# Altium footprint library u025Library.PcbLib: 132 footprints (part 4 of 9)
Each footprint in its own frame and in the unit in brackets; x right, y up, seen from the top. Pads: shape width x height; smd on the part's side, far side on the other; paste and mask are expansions set on the pad; w line width, h text height; cw(c..) or ccw(c..) is an arc to the next point about the centre after c.
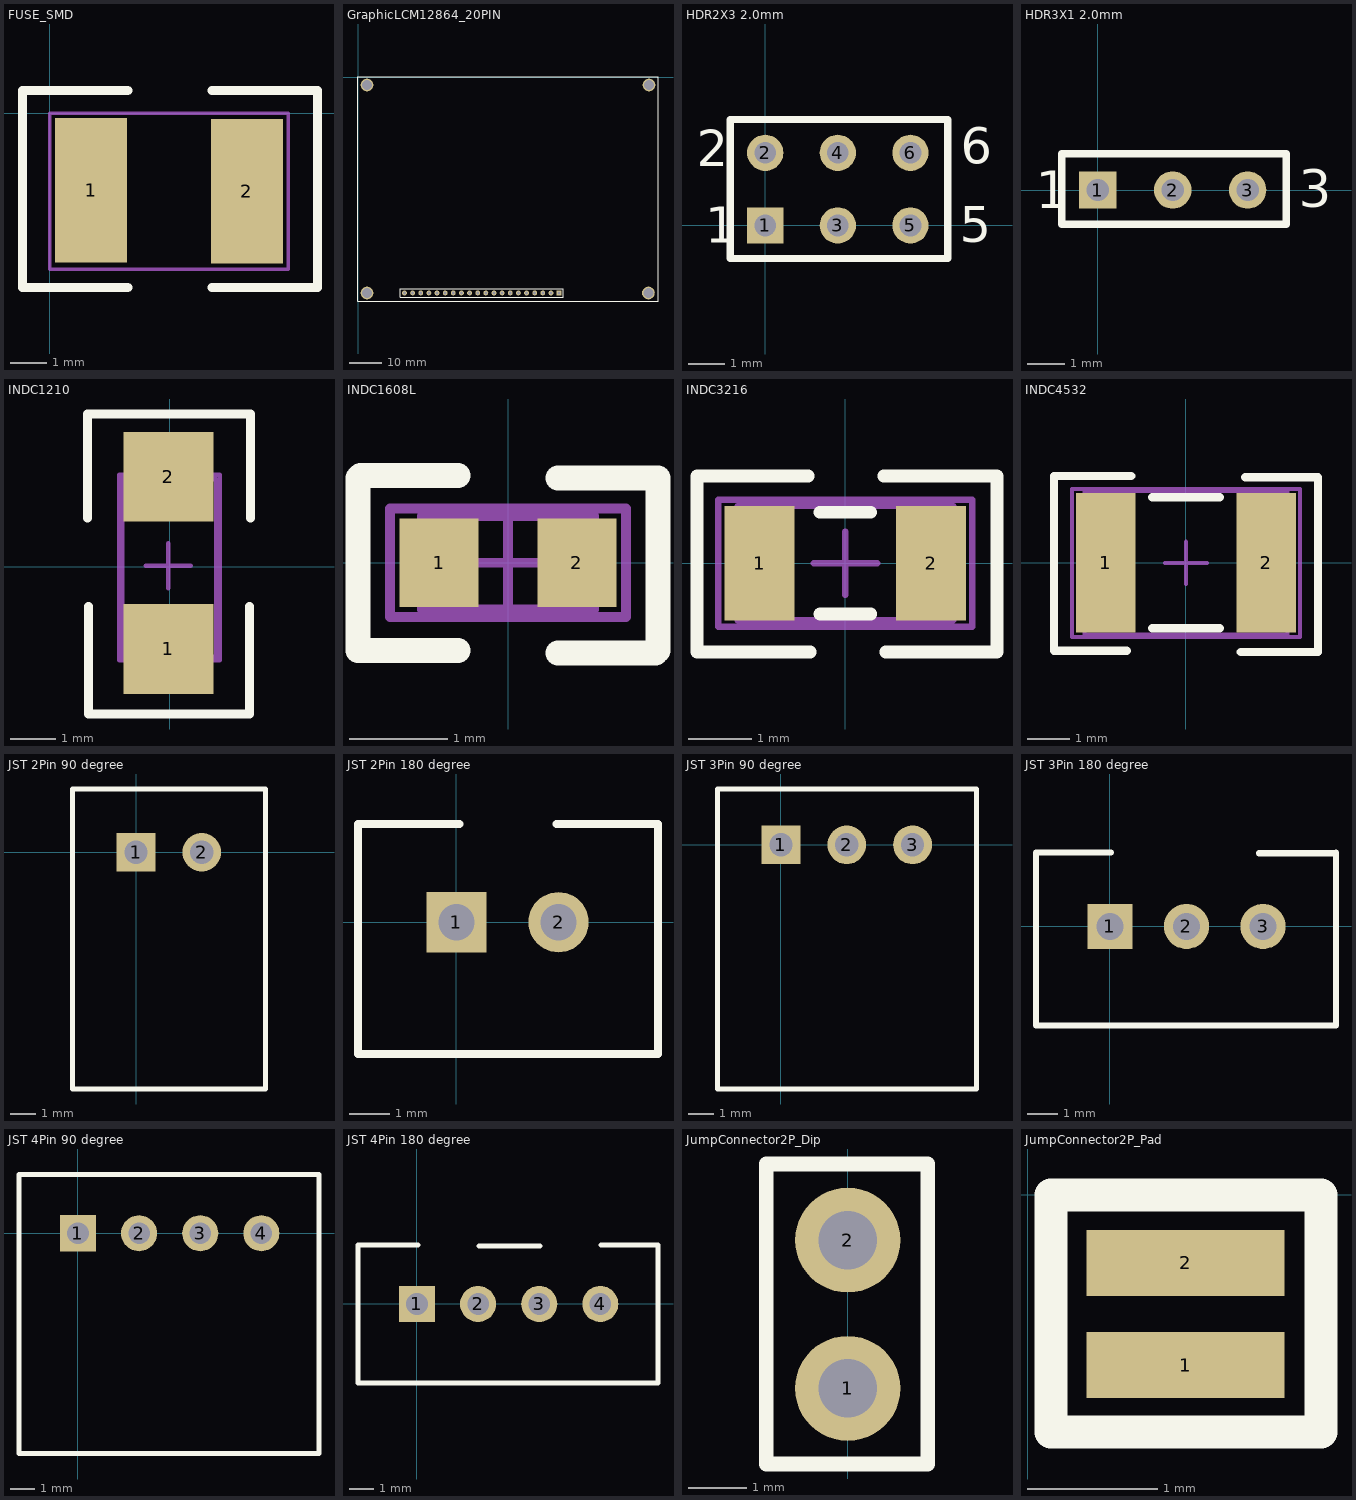
[diagram p3: the footprints below, top view; thin cyan lines are the x and y axes]

## FUSE_SMD [mm] "FUSE_SMD"
pads (2):
  rect 2x4 smd: 1(1.143,-2.134) 2(5.461,-2.159)
Top Overlay:
  lines w0.254: 2.159,-4.826 -0.762,-4.826 -0.762,0.635 2.159,0.635 ; 4.496,-4.826 7.417,-4.826 7.417,0.635 4.496,0.635
Mechanical 15:
  lines w0.1: 0,-4.318 0,0 6.604,0 6.604,-4.318 0,-4.318
3D body: height 1.03, standoff 0, extent 0.881,-3.899 5.616,-0.419

## GraphicLCM12864_20PIN [mm] "GraphicLCM12864_20PIN_15mm"
height 20
pads (24):
  rect 1.5x1.5 hole 0.9: 1(62.726,-67.386)
  round 1.5 hole 0.9: 2(60.186,-67.386) 3(57.646,-67.386) 4(55.106,-67.386) 5(52.566,-67.386) 6(50.026,-67.386) 7(47.486,-67.386) 8(44.946,-67.386) 9(42.406,-67.386) 10(39.866,-67.386) 11(37.326,-67.386) 12(34.786,-67.386) 13(32.246,-67.386) 14(29.706,-67.386) 15(27.166,-67.386) 16(24.626,-67.386) 17(22.086,-67.386) 18(19.546,-67.386) 19(17.006,-67.386) 20(14.466,-67.386)
  round 4 hole 3.2: ""(2.766,-67.386) ""(2.766,-2.474) ""(90.587,-67.386) ""(90.787,-2.474)
Top Overlay:
  lines w0.2: 13.196,-68.656 62.091,-68.656 63.996,-68.656 63.996,-66.116 13.196,-66.116 13.196,-68.656
  lines w0.254: -0.034,-69.9 93.587,-69.9 93.587,0.026 -0.034,0.026 -0.034,-69.9
3D body: height -7, standoff -20.6, extent 0.598,-69.977 93.598,0.023

## HDR2X3 2.0mm [mm] "Connector; Header; 3x2 Position 2.0mm"
pads (6):
  rect 1x1 hole 0.6: 1(0,0)
  round 1 hole 0.6: 2(0,2) 3(2,0) 4(2,2) 5(4,0) 6(4,2)
Top Overlay:
  lines w0.2: -0.965,-0.914 5.029,-0.914 5.029,2.921 -0.965,2.921 -0.965,-0.914
  text "1" at -1.651,-0.483 h1
  text "2" at -1.88,1.626 h1
  text "5" at 5.359,-0.457 h1
  text "6" at 5.385,1.702 h1

## HDR3X1 2.0mm [mm] "Connector; Header; 31 Position 2.0mm"
pads (3):
  rect 1x1 hole 0.6: 1(0,0)
  round 1 hole 0.6: 2(2,0) 3(4,0)
Top Overlay:
  lines w0.2: -0.965,-0.914 5.029,-0.914 5.029,0.968 -0.965,0.968 -0.965,-0.914
  text "1" at -1.651,-0.483 h1
  text "3" at 5.359,-0.457 h1

## INDC1210 [mm] "Chip Inductor, Body 3.2mm x 2.5mm, IPC High Density"
height 2
pads (2):
  rect 2x2 smd: 1(-0.025,-1.829) 2(-0.025,2.007)
Top Overlay:
  lines w0.2: -1.829,1.086 -1.829,3.404 1.803,3.404 1.803,1.086 ; -1.803,-0.883 -1.803,-3.277 1.778,-3.277 1.778,-0.883
Mechanical 13:
  lines w0.1: -1.052,-2.007 1.041,-2.007 1.041,1.956 -1.052,1.956 -1.052,-2.007
Mechanical 15:
  lines w0.1: -0.525,0.025 0.475,0.025 ; -0.025,-0.475 -0.025,0.525 ; -1.118,-2.083 1.118,-2.083 1.118,2.051 -1.118,2.051 -1.118,-2.083
3D body: height 3.2, standoff 0, extent -1.6,-2.098 1.6,2.402

## INDC1608L [mm] "Chip Inductor, Body 1.6x0.8mm, IPC High Density"
height 0.55
pads (2):
  rect 0.8x0.9 smd: 1(-0.7,0) 2(0.7,0)
Top Overlay:
  lines w0.254: -0.508,-0.889 -1.524,-0.889 -1.524,0.864 -1.499,0.889 -0.508,0.889 ; 0.508,-0.914 1.499,-0.914 ; 0.508,0.864 1.524,0.864 1.524,-0.889
Mechanical 13:
  lines w0.1: -0.875,-0.475 0.875,-0.475 0.875,0.475 -0.875,0.475 -0.875,-0.475
Mechanical 15:
  lines w0.1: -0.475,0 0.475,0 ; 0,-0.475 0,0.475 ; -1.2,-0.55 1.2,-0.55 1.2,0.55 -1.2,0.55 -1.2,-0.55
3D body: height 0.4, standoff -0.4, extent -0.8,-0.467 0.8,0.483

## INDC3216 [mm] "Chip Inductor, Body 3.2x1.6mm, IPC High Density"
height 0.55
pads (2):
  rect 1.1x1.8 smd: 1(-1.35,0) 2(1.35,0)
Top Overlay:
  lines w0.2: -0.584,1.372 -2.337,1.372 -2.337,-1.397 -0.552,-1.397 ; -0.4,-0.8 0.4,-0.8 ; -0.4,0.8 0.4,0.8 ; 0.603,1.372 2.388,1.372 2.388,-1.397 0.635,-1.397
Mechanical 13:
  lines w0.1: -1.7,-0.9 1.7,-0.9 1.7,0.9 -1.7,0.9 -1.7,-0.9
Mechanical 15:
  lines w0.1: -0.5,0 0.5,0 ; 0,-0.5 0,0.5 ; -2,-1 2,-1 2,1 -2,1 -2,-1
3D body: height 1.25, standoff -1.25, extent -1.498,-0.766 1.702,0.584

## INDC4532 [mm] "Chip Inductor, Body 4.5x3.2mm, IPC High Density"
height 0.55
pads (2):
  rect 1.4x3.3 smd: 1(-1.9,0) 2(1.9,0)
Top Overlay:
  lines w0.2: -1.397,-2.083 -3.124,-2.083 -3.124,2.057 -1.295,2.057 ; -0.8,-1.55 0.8,-1.55 ; -0.8,1.55 0.8,1.55 ; 1.295,-2.108 3.124,-2.108 3.124,2.032 1.397,2.032
Mechanical 13:
  lines w0.1: -2.4,-1.7 2.4,-1.7 2.4,1.7 -2.4,1.7 -2.4,-1.7
Mechanical 15:
  lines w0.1: -0.5,0 0.5,0 ; 0,-0.5 0,0.5 ; -2.7,-1.75 2.7,-1.75 2.7,1.75 -2.7,1.75 -2.7,-1.75
3D body: height 1.75, standoff 0, extent -2.148,-1.575 2.352,1.625

## JST 2Pin 90 degree [mm] "Connector; JST; 2 Position 90"
pads (2):
  rect 1.5x1.5 hole 0.9: 1(0,0)
  round 1.5 hole 0.9: 2(2.54,0)
Top Overlay:
  lines w0.2: 4.978,2.443 -2.45,2.443 -2.45,-9.151 4.996,-9.151 4.996,2.443
3D body: height 6.1, standoff -2, extent -2.442,-9.141 4.958,2.359

## JST 2Pin 180 degree [mm] "Connector; JST; 2 Position 180"
pads (2):
  rect 1.5x1.5 hole 0.9: 1(0,0)
  round 1.5 hole 0.9: 2(2.54,0)
Top Overlay:
  lines w0.2: 0.074,2.443 -2.45,2.443 -2.45,-3.28 5.013,-3.28 5.013,2.443 2.489,2.443
3D body: height 7, standoff -3.4, extent -2.384,-3.409 5.016,2.341

## JST 3Pin 90 degree [mm] "Connector; JST; 3 Position 90"
pads (3):
  rect 1.5x1.5 hole 0.9: 1(0,0)
  round 1.5 hole 0.9: 2(2.54,0) 3(5.08,0)
Top Overlay:
  lines w0.2: -2.45,-9.426 -2.45,2.153 7.551,2.153 7.551,-9.426 -2.45,-9.426
3D body: height 2.87, standoff -6.27, extent -2.453,-9.42 7.453,2.086

## JST 3Pin 180 degree [mm] "Connector; JST; 3 Position"
pads (3):
  rect 1.5x1.5 hole 0.9: 1(0,0)
  round 1.5 hole 0.9: 2(2.54,0) 3(5.08,0)
Top Overlay:
  lines w0.2: 0.043,2.443 -2.45,2.443 -2.45,-3.28 7.498,-3.28 7.498,2.443 ; 4.94,2.425 7.434,2.425
3D body: height 7, standoff -3.4, extent -2.44,-3.42 7.46,2.33

## JST 4Pin 90 degree [mm] "Connector; JST; 4 Position 90"
pads (4):
  rect 1.5x1.5 hole 0.9: 1(0,0)
  round 1.5 hole 0.9: 2(2.54,0) 3(5.08,0) 4(7.62,0)
Top Overlay:
  lines w0.2: -2.45,-9.151 -2.45,2.443 7.65,2.443 10.017,2.443 10.017,-9.151 -2.45,-9.151
3D body: height 3.05, standoff -6.45, extent -2.431,-9.147 9.969,2.353

## JST 4Pin 180 degree [mm] "Connector; JST; 4 Position"
pads (4):
  rect 1.5x1.5 hole 0.9: 1(0,0)
  round 1.5 hole 0.9: 2(2.54,0) 3(5.08,0) 4(7.62,0)
Top Overlay:
  lines w0.2: 0.043,2.443 -2.45,2.443 -2.45,-3.28 10.017,-3.28 10.017,2.443 7.65,2.443 ; 2.576,2.412 5.12,2.412
3D body: height 7, standoff -3.4, extent -2.42,-3.334 9.98,2.416

## JumpConnector2P_Dip [mm] "JumpConnector Hold 2.54mm"
pads (2):
  round 1.8 hole 1: 1(0,-5.08) 2(0,-2.54)
Top Overlay:
  lines w0.254: -1.397,-6.375 -1.397,-1.235 1.372,-1.235 1.372,-6.375 -1.397,-6.375

## JumpConnector2P_Pad [mil] "JumpConnector SMD Pad Only"
pads (2):
  rect 60x20 smd: 1(47.87,-51.6) 2(47.87,-20.6)
Top Overlay:
  lines w10: 7,-71.91 89,-71.91 89,0 7,0 7,-71.91